# Altium footprint library WARG.PcbLib: 73 footprints (part 2 of 5)
Each footprint in its own frame and in the unit in brackets; x right, y up, seen from the top. Pads: shape width x height; smd on the part's side, far side on the other; paste and mask are expansions set on the pad; w line width, h text height; cw(c..) or ccw(c..) is an arc to the next point about the centre after c.
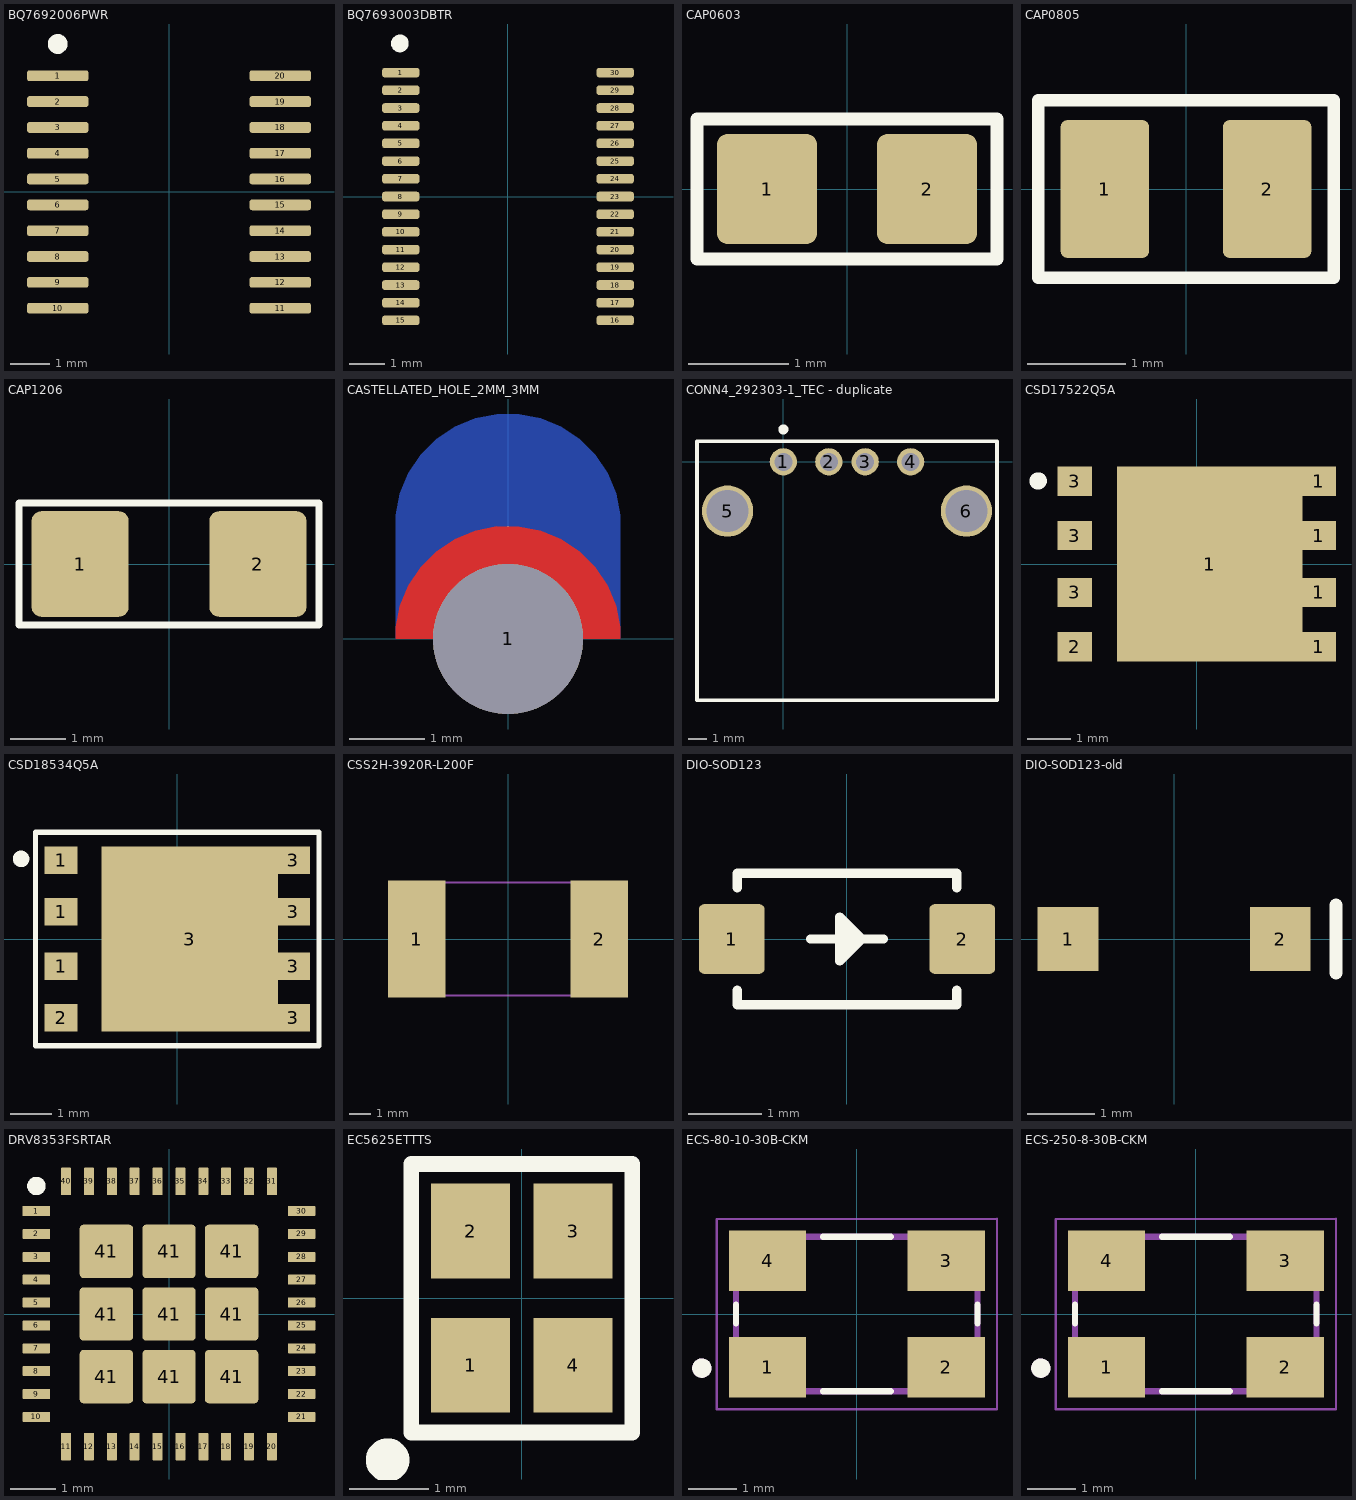
[diagram p1: the footprints below, top view; thin cyan lines are the x and y axes]

## BQ7692006PWR [mm] "IC BATT MON MULTI 3-5C 20TSSOP"
pads (20):
  rrect50% 1.55x0.27 smd: 1(-2.8,2.925) 2(-2.8,2.275) 3(-2.8,1.625) 4(-2.8,0.975) 5(-2.8,0.325) 6(-2.8,-0.325) 7(-2.8,-0.975) 8(-2.8,-1.625) 9(-2.8,-2.275) 10(-2.8,-2.925) 11(2.8,-2.925) 12(2.8,-2.275) 13(2.8,-1.625) 14(2.8,-0.975) 15(2.8,-0.325) 16(2.8,0.325) 17(2.8,0.975) 18(2.8,1.625) 19(2.8,2.275) 20(2.8,2.925)
Top Overlay:
  circle w0.25: c-2.8,3.725 r0.125
3D body "BQ7692006PWR.stp": height 1.13, standoff 0, extent -3.2,-3.25 3.2,3.25

## BQ7693003DBTR [mm]
pads (30):
  rrect50% 1.05x0.27 smd: 1(-3.029,3.5) 2(-3.029,3) 3(-3.029,2.5) 4(-3.029,2) 5(-3.029,1.5) 6(-3.029,1) 7(-3.029,0.5) 8(-3.029,0) 9(-3.029,-0.5) 10(-3.029,-1) 11(-3.029,-1.5) 12(-3.029,-2) 13(-3.029,-2.5) 14(-3.029,-3) 15(-3.029,-3.5) 16(3.029,-3.5) 17(3.029,-3) 18(3.029,-2.5) 19(3.029,-2) 20(3.029,-1.5) 21(3.029,-1) 22(3.029,-0.5) 23(3.029,0) 24(3.029,0.5) 25(3.029,1) 26(3.029,1.5) 27(3.029,2) 28(3.029,2.5) 29(3.029,3) 30(3.029,3.5)
Top Overlay:
  circle w0.25: c-3.054,4.325 r0.125
3D body "BQ7693003DBTR.stp": height 1.13, standoff 0, extent -3.2,-3.9 3.2,3.9

## CAP0603 [mm] "Ceramic Capacitor 0603"
height 0.55
pads (2):
  rrect20% 1x1.1 smd: 1(-0.8,0) 2(0.8,0)
Top Overlay:
  lines w0.127: -1.5,-0.7 1.5,-0.7 1.5,0.7 -1.5,0.7 -1.5,-0.7
Mechanical 13:
  lines w0.1: -0.875,-0.475 -0.875,0.475 ; 0.875,-0.475 0.875,0.475
3D body: height 0.55, standoff 0, extent 0.525,-0.475 0.875,0.475
3D body: height 0.55, standoff 0, extent -0.875,-0.475 -0.525,0.475
3D body "c0603c101j1gactu.stp": height 0.87, standoff 0, extent -0.875,-0.475 0.875,0.475

## CAP0805 [mm] "Ceramic Capacitor 0805"
pads (2):
  rrect15% 0.9x1.4 smd: 1(-0.825,0) 2(0.825,0)
Top Overlay:
  lines w0.127: -1.5,-0.9 -1.5,0.9 1.5,0.9 1.5,-0.9 -1.5,-0.9
3D body "CAP0805.stp": height 1.39, standoff -0.01, extent -1.1,-0.725 1.1,0.725

## CAP1206 [mm] "Ceramic Capacitor 1206"
height 0.55
pads (2):
  rrect20% 1.75x1.9 smd: 1(-1.6,0) 2(1.6,0)
Top Overlay:
  lines w0.127: -2.7,-1.1 -2.7,1.1 2.7,1.1 2.7,-1.1 -2.7,-1.1
3D body "1206.stp": height 0.88, standoff 0, extent -1.7,-0.9 1.7,0.9

## CASTELLATED_HOLE_2MM_3MM [mm]
pads (1):
  round 2 hole 2: 1(0,0)
Top Layer:
  region: -1.5,0 -1.5,0.148 -1.442,0.438 -1.329,0.711 -1.165,0.956 -0.956,1.165 -0.711,1.329 -0.438,1.442 -0.148,1.5 0.148,1.5 0.438,1.442 0.711,1.329 0.956,1.165 1.165,0.956 1.329,0.711 1.442,0.438 1.5,0.148 1.5,0 1,0 0.991,0.131 0.924,0.383 0.793,0.609 0.609,0.793 0.383,0.924 0.131,0.991 -0.131,0.991 -0.383,0.924 -0.609,0.793 -0.793,0.609 -0.924,0.383 -0.991,0.131 -1,0
Bottom Layer:
  region: -1.5,0 -1.5,1.5 -1.5,1.648 -1.442,1.938 -1.329,2.211 -1.165,2.456 -0.956,2.665 -0.711,2.829 -0.438,2.942 -0.148,3 0.148,3 0.438,2.942 0.711,2.829 0.956,2.665 1.165,2.456 1.329,2.211 1.442,1.938 1.5,1.648 1.5,1.5 1.5,0 1,0 0.991,0.131 0.924,0.383 0.793,0.609 0.609,0.793 0.383,0.924 0.131,0.991 -0.131,0.991 -0.383,0.924 -0.609,0.793 -0.793,0.609 -0.924,0.383 -0.991,0.131 -1,0

## CONN4_292303-1_TEC - duplicate [mil]
pads (6):
  round 59 hole 39: 1(0,0) 2(98.43,0) 3(177.17,0) 4(275.59,0)
  round 111 hole 91: 5(-120.87,-106.71) 6(396.46,-106.71)
Top Overlay:
  circle w13.78: c0,70 r4
  lines w7.87: -187.01,-187.01 -187.01,-38.28 -187.01,44.29 462.6,44.29 462.6,-38.28 462.6,-175.14 462.6,-516.71 -187.01,-516.71 -187.01,-175.14
3D body: height 10, standoff 0, extent 0,0 10,10
3D body "292303-1--3DModel-STEP-56544.STEP": height 290.46, standoff -161.31, extent -179.91,-510.59 450,40.59

## CSD17522Q5A [mm]
pads (9):
  rect 4.295x4.51 smd paste-3: 1(0.301,0)
  rect 0.8x0.675 smd paste-1: 1(2.825,-1.917) 1(2.825,-0.66) 1(2.825,0.66) 1(2.825,1.917) 2(-2.826,-1.917) 3(-2.826,-0.66) 3(-2.826,0.66) 3(-2.826,1.917)
Top Overlay:
  circle w0.3: c-3.675,1.925 r0.05
Top Paste:
  region: -2.526,-2.171 -3.031,-2.171 -3.031,-1.667 -2.526,-1.667
  region: -2.526,-0.91 -3.026,-0.91 -3.026,-0.41 -2.526,-0.41
  region: -2.526,0.41 -3.027,0.41 -3.027,0.91 -2.526,0.91
  region: -2.526,1.67 -3.03,1.67 -3.03,2.167 -2.526,2.167
  region: 3.026,-2.172 2.531,-2.172 2.531,-1.667 3.026,-1.667
  region: 3.026,-0.91 2.528,-0.91 2.528,-0.41 3.026,-0.41
  region: 3.026,0.41 2.528,0.41 2.528,0.91 3.026,0.91
  region: 3.026,1.668 2.527,1.668 2.527,2.167 3.026,2.167
  region: 1.911,-1.882 0.327,-1.882 0.327,-0.31 1.911,-0.31
  region: -0.174,-1.883 -1.411,-1.883 -1.411,-0.31 -0.174,-0.31
  region: 1.911,0.31 0.327,0.31 0.327,1.88 1.911,1.88
  region: -0.174,0.31 -1.409,0.31 -1.409,1.88 -0.174,1.88
3D body "DQJ0008A.stp": height 1.16, standoff 0.01, extent -3.13,-2.45 3.13,2.45

## CSD18534Q5A [mm]
pads (9):
  rect 0.8x0.675 smd paste-1: 1(-2.826,-0.66) 1(-2.826,0.66) 1(-2.826,1.917) 2(-2.826,-1.917) 3(2.825,-1.917) 3(2.825,-0.66) 3(2.825,0.66) 3(2.825,1.917)
  rect 4.295x4.51 smd paste-3: 3(0.301,0)
Top Overlay:
  circle w0.3: c-3.8,1.95 r0.05
  lines w0.127: -3.45,-2.6 3.45,-2.6 3.45,2.6 -3.45,2.6 -3.45,-2.6
Top Paste:
  region: -2.526,-2.171 -3.031,-2.171 -3.031,-1.667 -2.526,-1.667
  region: -2.526,-0.91 -3.026,-0.91 -3.026,-0.41 -2.526,-0.41
  region: -2.526,0.41 -3.027,0.41 -3.027,0.91 -2.526,0.91
  region: -2.526,1.67 -3.03,1.67 -3.03,2.167 -2.526,2.167
  region: 3.026,-2.172 2.531,-2.172 2.531,-1.667 3.026,-1.667
  region: 3.026,-0.91 2.528,-0.91 2.528,-0.41 3.026,-0.41
  region: 3.026,0.41 2.528,0.41 2.528,0.91 3.026,0.91
  region: 3.026,1.668 2.527,1.668 2.527,2.167 3.026,2.167
  region: 1.911,-1.882 0.327,-1.882 0.327,-0.31 1.911,-0.31
  region: -0.174,-1.883 -1.411,-1.883 -1.411,-0.31 -0.174,-0.31
  region: 1.911,0.31 0.327,0.31 0.327,1.88 1.911,1.88
  region: -0.174,0.31 -1.409,0.31 -1.409,1.88 -0.174,1.88
3D body "DQJ0008A.stp": height 1.16, standoff 0.01, extent -3.13,-2.45 3.13,2.45

## CSS2H-3920R-L200F [mm]
pads (2):
  rect 2.65x5.4 smd: 1(-4.2,0) 2(4.2,0)
Mechanical 13:
  lines w0.1: -5.02,-2.6 5.02,-2.6 5.02,2.6 -5.02,2.6 -5.02,-2.6
3D body "CSS2H-3920R-L200F.stp": height 1.3, standoff 0, extent -5.02,-2.6 5.02,2.6

## DIO-SOD123 [mm]
pads (2):
  rrect15% 0.9x0.95 smd: 1(-1.575,0) 2(1.575,0)
Top Overlay:
  region: -0.1,-0.3 0.2,0 -0.1,0.3
  lines w0.127: -1.5,-0.7 -1.5,-0.9 1.5,-0.9 1.5,-0.7 ; -1.5,0.7 -1.5,0.9 1.5,0.9 1.5,0.7 ; -0.5,0 -0.1,0 ; 0.5,0 0.2,0 ; 0.2,0 -0.1,0.3 -0.1,-0.3 0.2,0
3D body "User Library-SOD-123_DiodesInc.step": height 1.46, standoff 0.01, extent -1.925,-0.838 1.925,0.862

## DIO-SOD123-old [mm]
pads (2):
  rect 0.9x0.95 smd: 1(-1.575,0) 2(1.575,0)
Top Overlay:
  lines w0.2: 2.4,-0.5 2.4,0.5
3D body "User Library-SOD-123_DiodesInc.step": height 1.46, standoff 0.01, extent -1.925,-0.838 1.925,0.862

## DRV8353FSRTAR [mm]
pads (49):
  rect 0.6x0.22 smd: 1(-2.9,2.25)
  rrect15% 0.6x0.22 smd: 2(-2.9,1.75) 3(-2.9,1.25) 4(-2.9,0.75) 5(-2.9,0.25) 6(-2.9,-0.25) 7(-2.9,-0.75) 8(-2.9,-1.25) 9(-2.9,-1.75) 10(-2.9,-2.25) 21(2.9,-2.25) 22(2.9,-1.75) 23(2.9,-1.25) 24(2.9,-0.75) 25(2.9,-0.25) 26(2.9,0.25) 27(2.9,0.75) 28(2.9,1.25) 29(2.9,1.75) 30(2.9,2.25)
  rrect15% 0.22x0.6 smd: 11(-2.25,-2.9) 12(-1.75,-2.9) 13(-1.25,-2.9) 14(-0.75,-2.9) 15(-0.25,-2.9) 16(0.25,-2.9) 17(0.75,-2.9) 18(1.25,-2.9) 19(1.75,-2.9) 20(2.25,-2.9) 31(2.25,2.9) 32(1.75,2.9) 33(1.25,2.9) 34(0.75,2.9) 35(0.25,2.9) 36(-0.25,2.9) 37(-0.75,2.9) 38(-1.25,2.9) 39(-1.75,2.9) 40(-2.25,2.9)
  rrect15% 1.17x1.17 smd: 41(-1.37,-1.37) 41(-1.37,0) 41(-1.37,1.37) 41(0,-1.37) 41(0,0) 41(0,1.37) 41(1.37,-1.37) 41(1.37,0) 41(1.37,1.37)
Top Overlay:
  circle w0.254: c-2.9,2.8 r0.075

## EC5625ETTTS [mm] "Footprint for EC5625ETTTS-8.000M TR"
pads (4):
  rect 1x1.2 smd: 1(-0.65,-0.85) 2(-0.65,0.85) 3(0.65,0.85) 4(0.65,-0.85)
Top Overlay:
  circle w0.45: c-1.7,-2.05 r0.05
  lines w0.2: -1.4,-1.7 -1.4,1.7 1.4,1.7 1.4,-1.7 -1.4,-1.7
3D body: height 1, standoff 0, extent -1,-1.25 1,1.25

## ECS-80-10-30B-CKM [mm] "Copy of ECS-250-8-30B-CKM as both share the ECX-53B  SMD CRYSTAL footprint"
pads (4):
  rect 1.6x1.25 smd: 1(-1.85,-1.1) 2(1.85,-1.1) 3(1.85,1.1) 4(-1.85,1.1)
Top Overlay:
  circle w0.2: c-3.21,-1.12 r0.1
  lines w0.127: -2.5,-0.2 -2.5,0.2 ; -0.7,-1.6 0.7,-1.6 ; -0.7,1.6 0.7,1.6 ; 2.5,-0.2 2.5,0.2
Mechanical 13:
  circle w0.2: c-3.21,-1.12 r0.1
  lines w0.127: -2.5,-1.6 -2.5,1.6 2.5,1.6 2.5,-1.6 -2.5,-1.6
Mechanical 15:
  lines w0.05: -2.9,-1.975 -2.9,1.96 2.9,1.975 2.9,-1.975 -2.9,-1.975
3D body "step_temp.STEP": height 0.85, standoff 0, extent -2.5,-1.6 2.5,1.6

## ECS-250-8-30B-CKM [mm]
pads (4):
  rect 1.6x1.25 smd: 1(-1.85,-1.1) 2(1.85,-1.1) 3(1.85,1.1) 4(-1.85,1.1)
Top Overlay:
  circle w0.2: c-3.21,-1.12 r0.1
  lines w0.127: -2.5,-0.2 -2.5,0.2 ; -0.7,-1.6 0.7,-1.6 ; -0.7,1.6 0.7,1.6 ; 2.5,-0.2 2.5,0.2
Mechanical 13:
  circle w0.2: c-3.21,-1.12 r0.1
  lines w0.127: -2.5,-1.6 2.5,-1.6 2.5,1.6 -2.5,1.6 -2.5,-1.6
Mechanical 15:
  lines w0.05: -2.9,-1.975 2.9,-1.975 2.9,1.975 -2.9,1.96 -2.9,-1.975
3D body "step_temp.STEP": height 0.85, standoff 0, extent -2.5,-1.6 2.5,1.6